# Altium footprint library PowerProducts.PCBLIB: 166 footprints (part 9 of 11)
Each footprint in its own frame and in the unit in brackets; x right, y up, seen from the top. Pads: shape width x height; smd on the part's side, far side on the other; paste and mask are expansions set on the pad; w line width, h text height; cw(c..) or ccw(c..) is an arc to the next point about the centre after c.
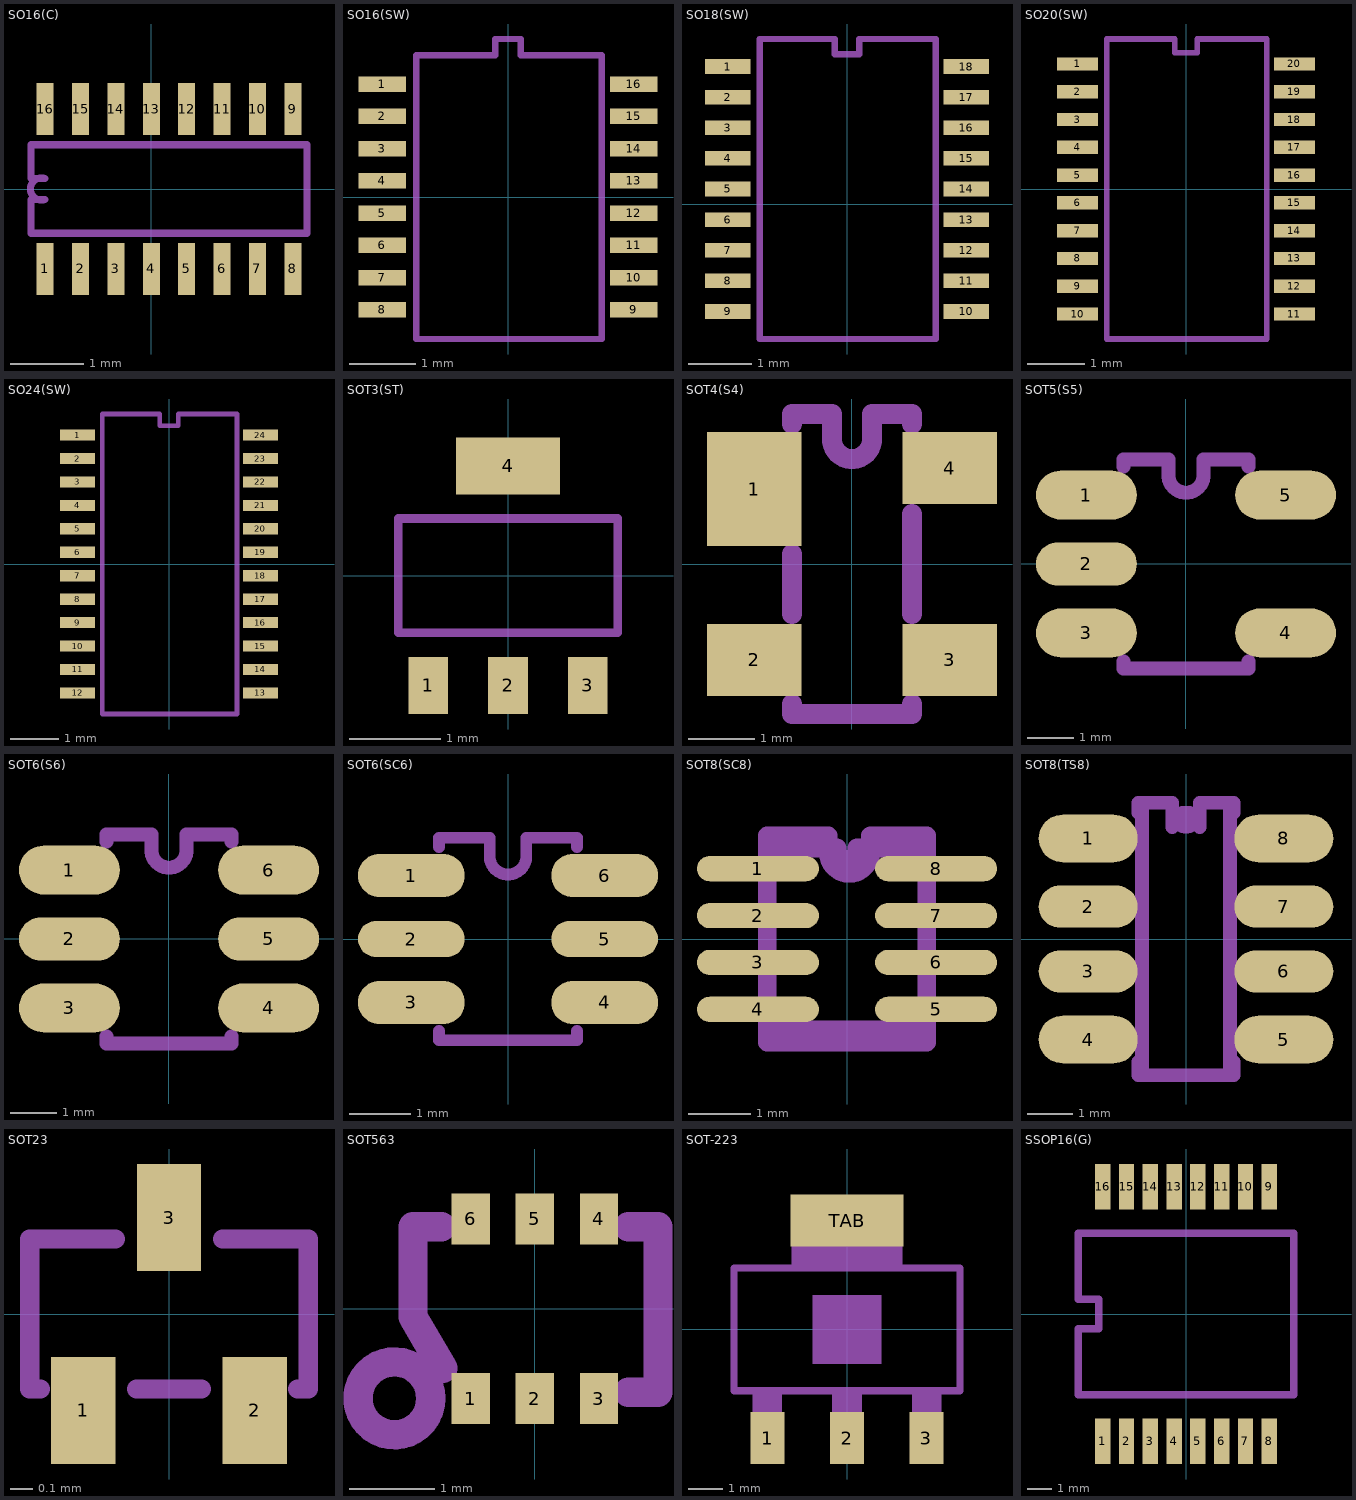
[diagram p8: the footprints below, top view; thin cyan lines are the x and y axes]

## SO16(C) [mil]
pads (16):
  rect 9.14x28.19 smd: 1(-57.15,-43.05) 2(-38.1,-43.05) 3(-19.05,-43.05) 4(0,-43.05) 5(19.05,-43.05) 6(38.1,-43.05) 7(57.15,-43.05) 8(76.2,-43.05) 9(76.2,43.05) 10(57.15,43.05) 11(38.1,43.05) 12(19.05,43.05) 13(0,43.05) 14(-19.05,43.05) 15(-38.1,43.05) 16(-57.15,43.05)
Mechanical 2:
  lines w3.81: -64.77,-23.81 83.82,-23.81 83.82,23.81 -64.77,23.81 -64.77,5.72 -57.15,5.72 ccw(c-59.05,0) -57.15,-5.71 -64.77,-5.72 -64.77,-23.81

## SO16(SW) [mil]
pads (16):
  rect 28.19x9.14 smd: 1(-74.3,66.68) 2(-74.3,47.63) 3(-74.3,28.58) 4(-74.3,9.53) 5(-74.3,-9.53) 6(-74.3,-28.58) 7(-74.3,-47.63) 8(-74.3,-66.68) 9(74.3,-66.68) 10(74.3,-47.63) 11(74.3,-28.58) 12(74.3,-9.53) 13(74.3,9.53) 14(74.3,28.58) 15(74.3,47.63) 16(74.3,66.68)
Mechanical 2:
  lines w3.81: -54.29,-83.82 55.25,-83.82 55.25,83.82 7.62,83.82 7.62,93.35 -7.62,93.35 -7.62,83.82 -54.29,83.82 -54.29,-83.82

## SO18(SW) [mil]
pads (18):
  rect 28.19x9.14 smd: 1(-74.3,85.73) 2(-74.3,66.68) 3(-74.3,47.63) 4(-74.3,28.58) 5(-74.3,9.53) 6(-74.3,-9.53) 7(-74.3,-28.58) 8(-74.3,-47.63) 9(-74.3,-66.68) 10(74.3,-66.68) 11(74.3,-47.63) 12(74.3,-28.58) 13(74.3,-9.53) 14(74.3,9.53) 15(74.3,28.58) 16(74.3,47.63) 17(74.3,66.68) 18(74.3,85.73)
Mechanical 2:
  lines w3.81: -54.29,-83.82 55.25,-83.82 55.25,102.87 7.62,102.87 7.62,93.35 -7.62,93.35 -7.62,102.87 -54.29,102.87 -54.29,-83.82

## SO20(SW) [mil]
pads (20):
  rect 28.19x9.14 smd: 1(-74.3,85.73) 2(-74.3,66.68) 3(-74.3,47.63) 4(-74.3,28.58) 5(-74.3,9.53) 6(-74.3,-9.53) 7(-74.3,-28.58) 8(-74.3,-47.63) 9(-74.3,-66.68) 10(-74.3,-85.73) 11(74.3,-85.73) 12(74.3,-66.68) 13(74.3,-47.63) 14(74.3,-28.58) 15(74.3,-9.53) 16(74.3,9.53) 17(74.3,28.58) 18(74.3,47.63) 19(74.3,66.68) 20(74.3,85.73)
Mechanical 2:
  lines w3.81: -54.29,-102.87 55.25,-102.87 55.25,102.87 7.62,102.87 7.62,93.35 -7.62,93.35 -7.62,102.87 -54.29,102.87 -54.29,-102.87

## SO24(SW) [mil]
pads (24):
  rect 28.19x9.14 smd: 1(-74.3,104.78) 2(-74.3,85.73) 3(-74.3,66.68) 4(-74.3,47.63) 5(-74.3,28.58) 6(-74.3,9.53) 7(-74.3,-9.53) 8(-74.3,-28.58) 9(-74.3,-47.63) 10(-74.3,-66.68) 11(-74.3,-85.73) 12(-74.3,-104.78) 13(74.3,-104.78) 14(74.3,-85.73) 15(74.3,-66.68) 16(74.3,-47.63) 17(74.3,-28.58) 18(74.3,-9.53) 19(74.3,9.53) 20(74.3,28.58) 21(74.3,47.63) 22(74.3,66.68) 23(74.3,85.73) 24(74.3,104.78)
Mechanical 2:
  lines w3.81: -54.29,-121.92 55.25,-121.92 55.25,121.92 7.62,121.92 7.62,112.4 -7.62,112.4 -7.62,121.92 -54.29,121.92 -54.29,-121.92

## SOT3(ST) [mil]
pads (4):
  rect 17.15x24.77 smd: 1(-34.67,-47.63) 2(0,-47.63) 3(34.67,-47.63)
  rect 44.96x24.77 smd: 4(0,47.63)
Mechanical 2:
  lines w3.81: -47.63,-24.77 -47.63,24.77 47.63,24.77 47.63,-24.77 -47.63,-24.77

## SOT4(S4) [mm]
pads (4):
  rect 1.416x1.716 smd: 1(-1.467,1.125)
  rect 1.416x1.08 smd: 2(-1.467,-1.44) 3(1.467,-1.44) 4(1.467,1.44)
Mechanical 2:
  lines w0.3: -0.9,-2.1 -0.9,-2.25 0.9,-2.25 0.9,-2.1 ; -0.9,-0.75 -0.9,0.15 ; -0.9,2.1 -0.9,2.25 -0.3,2.25 -0.3,1.884 ccw(c0,1.875) 0.3,1.884 0.3,2.25 0.9,2.25 0.9,2.1 ; 0.9,-0.75 0.9,0.75

## SOT5(S5) [mm]
pads (5):
  rrect100% 2.175x1.05 smd: 1(-2.145,1.485) 3(-2.145,-1.485) 4(2.145,-1.485) 5(2.145,1.485)
  rrect100% 2.175x0.93 smd: 2(-2.145,0)
Mechanical 2:
  lines w0.3: -1.35,-2.1 -1.35,-2.25 1.35,-2.25 1.35,-2.1 ; -1.35,2.1 -1.35,2.25 -0.375,2.25 -0.375,1.877 ccw(c0,1.911) 0.375,1.877 0.375,2.25 1.35,2.25 1.35,2.1

## SOT6(S6) [mm]
pads (6):
  rrect100% 2.175x1.05 smd: 1(-2.145,1.485) 3(-2.145,-1.485) 4(2.145,-1.485) 6(2.145,1.485)
  rrect100% 2.175x0.93 smd: 2(-2.145,0) 5(2.145,0)
Mechanical 2:
  lines w0.3: -1.35,-2.1 -1.35,-2.25 1.35,-2.25 1.35,-2.1 ; -1.35,2.1 -1.35,2.25 -0.375,2.25 -0.375,1.877 ccw(c0,1.911) 0.375,1.877 0.375,2.25 1.35,2.25 1.35,2.1

## SOT6(SC6) [mil]
pads (6):
  rrect100% 68.5x27.76 smd: 1(-62.01,40.75) 3(-62.01,-40.75) 4(62.01,-40.75) 6(62.01,40.75)
  rrect100% 68.5x23.03 smd: 2(-62.01,0) 5(62.01,0)
Mechanical 2:
  lines w7.5: -44.29,-59.06 -44.29,-64.96 44.29,-64.96 44.29,-59.06 ; -44.29,59.06 -44.29,64.96 -11.81,64.96 -11.81,53.15 ccw(c0,53.15) 11.81,53.15 11.81,64.96 44.29,64.96 44.29,59.06

## SOT8(SC8) [mil]
pads (8):
  rrect100% 76.77x15.94 smd: 1(-56.1,44.29) 2(-56.1,14.76) 3(-56.1,-14.76) 4(-56.1,-44.29) 5(56.1,-44.29) 6(56.1,-14.76) 7(56.1,14.76) 8(56.1,44.29)
Mechanical 2:
  lines w11.81: -50.2,-59.06 -50.2,-64.96 50.2,-64.96 50.2,-59.06 ; -50.2,59.06 -50.2,64.96 -11.81,64.96 -11.81,53.91 ccw(c1.48,54.64) 14.76,53.9 14.76,64.96 50.2,64.96 50.2,59.06 ; -50.2,-57.28 -50.2,57.28 -6.27,57.28 -6.27,50.12 6.27,50.12 6.27,57.28 50.2,57.28 50.2,-57.28 -50.2,-57.28

## SOT8(TS8) [mm]
pads (8):
  rrect100% 2.175x1.05 smd: 1(-2.152,2.213) 4(-2.152,-2.213) 5(2.152,-2.213) 8(2.152,2.213)
  rrect100% 2.175x0.93 smd: 2(-2.152,0.712) 3(-2.152,-0.712) 6(2.152,-0.712) 7(2.152,0.712)
Mechanical 2:
  lines w0.3: -1.05,-2.7 -1.05,-3 1.05,-3 1.05,-2.7 ; -1.05,2.775 -1.05,3 -0.967,3 ; -0.3,2.74 ccw(c0,2.778) 0.3,2.74 ; 1.05,2.775 1.05,3 0.967,3 ; -0.967,3 -0.3,3 -0.3,2.461 cw(c0,2.48) 0.3,2.461 0.3,3 0.967,3 ; -0.967,3 -0.967,-3 0.967,-3 0.967,3

## SOT23 [mil]
pads (3):
  rect 11.43x19.05 smd: 1(-15.24,-17.15) 2(15.24,-17.15) 3(0,17.15)
Mechanical 2:
  lines w3.43: -22.86,-13.34 -24.77,-13.34 -24.77,13.34 -9.53,13.34 ; -5.72,-13.34 5.72,-13.34 ; 9.53,13.34 24.77,13.34 24.77,-13.34 22.86,-13.34

## SOT563 [mil]
pads (6):
  rect 17.72x23.62 smd: 1(-29.53,-41.34) 2(0,-41.34) 3(29.53,-41.34) 4(29.53,41.34) 5(0,41.34) 6(-29.53,41.34)
Mechanical 2:
  circle w13.5: c-64.64,-41.25 r16.77
  lines w13.5: -43.11,37.8 -56.1,37.8 -56.1,-3.75 -42.34,-27.34 ; 43.11,-38.39 56.69,-38.39 56.69,37.8 43.11,37.8

## SOT-223 [mil]
pads (4):
  rect 39x59 smd: 1(-90.5,-124) 2(0,-124) 3(90.5,-124)
  rect 129x59 smd: TAB(0,124)
Mechanical 2:
  lines w8: -129.02,-70 129.02,-70 129.02,70 -129.02,70 -129.02,-70
Mechanical 8:
  rectangle: -39.37,-39.37 39.37,39.37
Mechanical 18:
  rectangle: -63,71 63,144
  rectangle: -17,-144 17,-71
  rectangle: -108,-144 -74,-71
  rectangle: 74,-144 108,-71
  rectangle: -63,71 63,144
  rectangle: -17,-144 17,-71
  rectangle: -108,-144 -74,-71
  rectangle: 74,-144 108,-71

## SSOP16(G) [mil]
pads (16):
  rect 24.8x73.82 smd: 1(-134.35,-205.22) 2(-95.96,-205.22) 3(-57.58,-205.22) 4(-19.19,-205.22) 5(19.19,-205.22) 6(57.58,-205.22) 7(95.96,-205.22) 8(134.35,-205.22) 9(134.35,205.22) 10(95.96,205.22) 11(57.58,205.22) 12(19.19,205.22) 13(-19.19,205.22) 14(-57.58,205.22) 15(-95.96,205.22) 16(-134.35,205.22)
Mechanical 2:
  lines w12: -174.21,-130.22 -174.21,-23.62 -140.77,-23.62 -140.77,23.62 -174.21,23.62 -174.21,130.22 174.21,130.22 174.21,-130.22 -174.21,-130.22